# Altium footprint library Test.PcbLib: 245 footprints (part 10 of 17)
Each footprint in its own frame and in the unit in brackets; x right, y up, seen from the top. Pads: shape width x height; smd on the part's side, far side on the other; paste and mask are expansions set on the pad; w line width, h text height; cw(c..) or ccw(c..) is an arc to the next point about the centre after c.
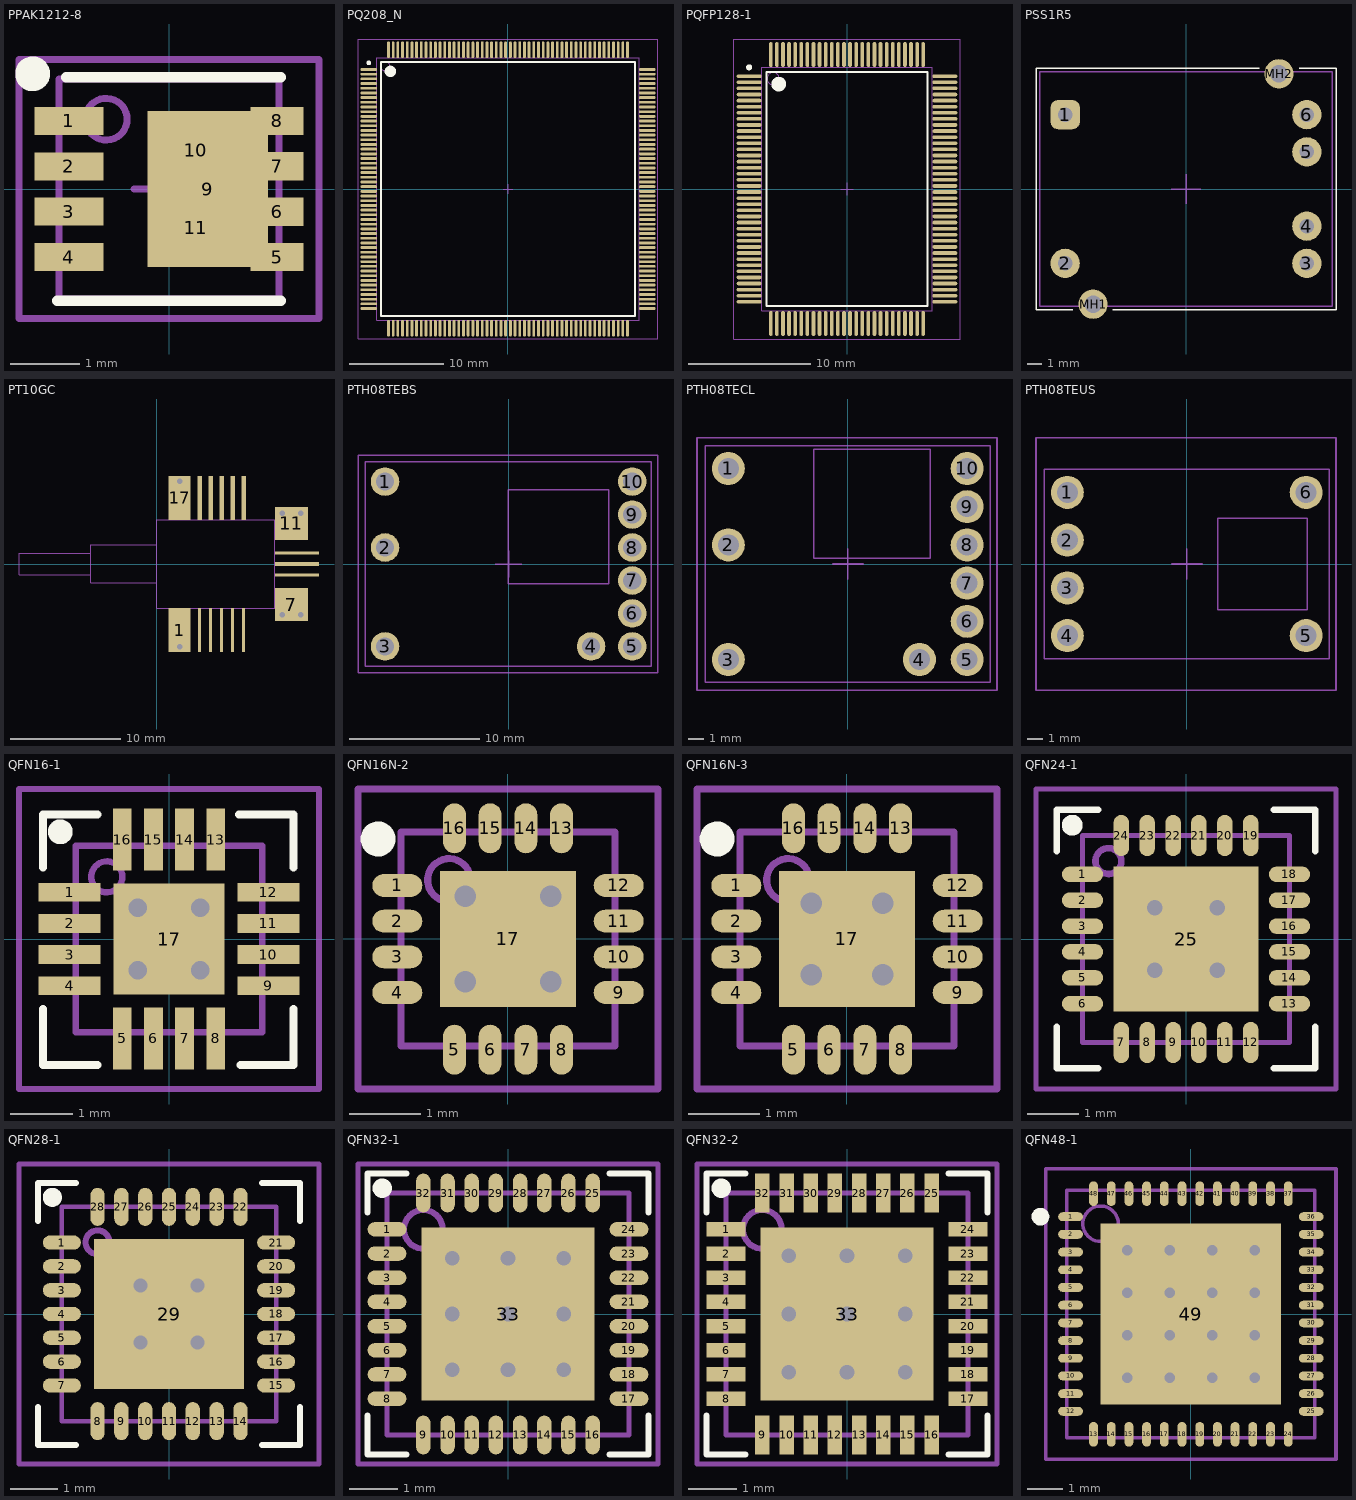
[diagram p9: the footprints below, top view; thin cyan lines are the x and y axes]

## PPAK1212-8 [mm] "QFN, 8-Leads, Body 3,2x3,2mm (max), Pitch 0,65mm, IPC Medium Density"
height 1.1
pads (11):
  rect 0.99x0.4 smd: 1(-1.435,0.975) 2(-1.435,0.325) 3(-1.435,-0.325) 4(-1.435,-0.975)
  rect 0.76x0.406 smd: 5(1.55,-0.975) 6(1.55,-0.325) 7(1.55,0.325) 8(1.55,0.975)
  rect 1.725x2.235 smd paste-2.54: 9(0.557,0)
  rect 1.016x0.813 on Top Paste: 10(0.381,0.559) 11(0.381,-0.559)
Top Overlay:
  circle w0.25: c-1.954,1.651 r0.125
  lines w0.15: -1.6,-1.6 1.6,-1.6 ; -1.473,1.6 1.6,1.6
Mechanical 13:
  circle w0.1: c-0.9,1 r0.3
  lines w0.1: -1.575,-1.575 -1.575,1.575 1.575,1.575 1.575,-1.575 -1.575,-1.575
Mechanical 15:
  lines w0.1: -0.5,0 0.5,0 ; 0,-0.5 0,0.5 ; -2.15,-1.854 -2.15,1.854 2.15,1.854 2.15,-1.854 -2.15,-1.854
3D body: height 1.1, standoff 0.02, extent -1.575,-1.575 1.575,1.575
3D body: height 1.11, standoff 1.1, extent -1.206,0.694 -0.594,1.306

## PQ208_N [mm] "208-Pin Plastic Quad Flat Pack (PQ208), IPC Medium Density"
height 4.1
pads (208):
  oval 1.8x0.3 smd mask+0.051: 1(-14.85,12.75) 2(-14.85,12.25) 3(-14.85,11.75) 4(-14.85,11.25) 5(-14.85,10.75) 6(-14.85,10.25) 7(-14.85,9.75) 8(-14.85,9.25) 9(-14.85,8.75) 10(-14.85,8.25) 11(-14.85,7.75) 12(-14.85,7.25) 13(-14.85,6.75) 14(-14.85,6.25) 15(-14.85,5.75) 16(-14.85,5.25) 17(-14.85,4.75) 18(-14.85,4.25) 19(-14.85,3.75) 20(-14.85,3.25) 21(-14.85,2.75) 22(-14.85,2.25) 23(-14.85,1.75) 24(-14.85,1.25) 25(-14.85,0.75) 26(-14.85,0.25) 27(-14.85,-0.25) 28(-14.85,-0.75) 29(-14.85,-1.25) 30(-14.85,-1.75) 31(-14.85,-2.25) 32(-14.85,-2.75) 33(-14.85,-3.25) 34(-14.85,-3.75) 35(-14.85,-4.25) 36(-14.85,-4.75) 37(-14.85,-5.25) 38(-14.85,-5.75) 39(-14.85,-6.25) 40(-14.85,-6.75) 41(-14.85,-7.25) 42(-14.85,-7.75) 43(-14.85,-8.25) 44(-14.85,-8.75) 45(-14.85,-9.25) 46(-14.85,-9.75) 47(-14.85,-10.25) 48(-14.85,-10.75) 49(-14.85,-11.25) 50(-14.85,-11.75) 51(-14.85,-12.25) 52(-14.85,-12.75) 105(14.85,-12.75) 106(14.85,-12.25) 107(14.85,-11.75) 108(14.85,-11.25) 109(14.85,-10.75) 110(14.85,-10.25) 111(14.85,-9.75) 112(14.85,-9.25) 113(14.85,-8.75) 114(14.85,-8.25) 115(14.85,-7.75) 116(14.85,-7.25) 117(14.85,-6.75) 118(14.85,-6.25) 119(14.85,-5.75) 120(14.85,-5.25) 121(14.85,-4.75) 122(14.85,-4.25) 123(14.85,-3.75) 124(14.85,-3.25) 125(14.85,-2.75) 126(14.85,-2.25) 127(14.85,-1.75) 128(14.85,-1.25) 129(14.85,-0.75) 130(14.85,-0.25) 131(14.85,0.25) 132(14.85,0.75) 133(14.85,1.25) 134(14.85,1.75) 135(14.85,2.25) 136(14.85,2.75) 137(14.85,3.25) 138(14.85,3.75) 139(14.85,4.25) 140(14.85,4.75) 141(14.85,5.25) 142(14.85,5.75) 143(14.85,6.25) 144(14.85,6.75) 145(14.85,7.25) 146(14.85,7.75) 147(14.85,8.25) 148(14.85,8.75) 149(14.85,9.25) 150(14.85,9.75) 151(14.85,10.25) 152(14.85,10.75) 153(14.85,11.25) 154(14.85,11.75) 155(14.85,12.25) 156(14.85,12.75)
  oval 0.3x1.8 smd mask+0.051: 53(-12.75,-14.85) 54(-12.25,-14.85) 55(-11.75,-14.85) 56(-11.25,-14.85) 57(-10.75,-14.85) 58(-10.25,-14.85) 59(-9.75,-14.85) 60(-9.25,-14.85) 61(-8.75,-14.85) 62(-8.25,-14.85) 63(-7.75,-14.85) 64(-7.25,-14.85) 65(-6.75,-14.85) 66(-6.25,-14.85) 67(-5.75,-14.85) 68(-5.25,-14.85) 69(-4.75,-14.85) 70(-4.25,-14.85) 71(-3.75,-14.85) 72(-3.25,-14.85) 73(-2.75,-14.85) 74(-2.25,-14.85) 75(-1.75,-14.85) 76(-1.25,-14.85) 77(-0.75,-14.85) 78(-0.25,-14.85) 79(0.25,-14.85) 80(0.75,-14.85) 81(1.25,-14.85) 82(1.75,-14.85) 83(2.25,-14.85) 84(2.75,-14.85) 85(3.25,-14.85) 86(3.75,-14.85) 87(4.25,-14.85) 88(4.75,-14.85) 89(5.25,-14.85) 90(5.75,-14.85) 91(6.25,-14.85) 92(6.75,-14.85) 93(7.25,-14.85) 94(7.75,-14.85) 95(8.25,-14.85) 96(8.75,-14.85) 97(9.25,-14.85) 98(9.75,-14.85) 99(10.25,-14.85) 100(10.75,-14.85) 101(11.25,-14.85) 102(11.75,-14.85) 103(12.25,-14.85) 104(12.75,-14.85) 157(12.75,14.85) 158(12.25,14.85) 159(11.75,14.85) 160(11.25,14.85) 161(10.75,14.85) 162(10.25,14.85) 163(9.75,14.85) 164(9.25,14.85) 165(8.75,14.85) 166(8.25,14.85) 167(7.75,14.85) 168(7.25,14.85) 169(6.75,14.85) 170(6.25,14.85) 171(5.75,14.85) 172(5.25,14.85) 173(4.75,14.85) 174(4.25,14.85) 175(3.75,14.85) 176(3.25,14.85) 177(2.75,14.85) 178(2.25,14.85) 179(1.75,14.85) 180(1.25,14.85) 181(0.75,14.85) 182(0.25,14.85) 183(-0.25,14.85) 184(-0.75,14.85) 185(-1.25,14.85) 186(-1.75,14.85) 187(-2.25,14.85) 188(-2.75,14.85) 189(-3.25,14.85) 190(-3.75,14.85) 191(-4.25,14.85) 192(-4.75,14.85) 193(-5.25,14.85) 194(-5.75,14.85) 195(-6.25,14.85) 196(-6.75,14.85) 197(-7.25,14.85) 198(-7.75,14.85) 199(-8.25,14.85) 200(-8.75,14.85) 201(-9.25,14.85) 202(-9.75,14.85) 203(-10.25,14.85) 204(-10.75,14.85) 205(-11.25,14.85) 206(-11.75,14.85) 207(-12.25,14.85) 208(-12.75,14.85)
Top Overlay:
  circle w0.6: c-12.55,12.55 r0.3
  circle w0.25: c-14.85,13.45 r0.125
  lines w0.2: -13.55,-13.55 13.55,-13.55 13.55,13.55 -13.55,13.55 -13.55,-13.55
Mechanical 13:
  circle w0.1: c-13.1,13.1 r0.5
  lines w0.1: -14,-14 14,-14 14,14 -14,14 -14,-14
Mechanical 15:
  lines w0.1: -0.5,0 0.5,0 ; 0,-0.5 0,0.5 ; -16,-16 16,-16 16,16 -16,16 -16,-16
3D body: height 4.1, standoff 0, extent -14,-14 14,14

## PQFP128-1 [mm] "PQFP, 128-Leads, Body 23,4x17,4mm (max), Pitch 0,50mm, IPC Medium Density"
height 3.4
pads (128):
  oval 2.05x0.305 smd mask+0.025: 1(-8.025,9.25) 2(-8.025,8.75) 3(-8.025,8.25) 4(-8.025,7.75) 5(-8.025,7.25) 6(-8.025,6.75) 7(-8.025,6.25) 8(-8.025,5.75) 9(-8.025,5.25) 10(-8.025,4.75) 11(-8.025,4.25) 12(-8.025,3.75) 13(-8.025,3.25) 14(-8.025,2.75) 15(-8.025,2.25) 16(-8.025,1.75) 17(-8.025,1.25) 18(-8.025,0.75) 19(-8.025,0.25) 20(-8.025,-0.25) 21(-8.025,-0.75) 22(-8.025,-1.25) 23(-8.025,-1.75) 24(-8.025,-2.25) 25(-8.025,-2.75) 26(-8.025,-3.25) 27(-8.025,-3.75) 28(-8.025,-4.25) 29(-8.025,-4.75) 30(-8.025,-5.25) 31(-8.025,-5.75) 32(-8.025,-6.25) 33(-8.025,-6.75) 34(-8.025,-7.25) 35(-8.025,-7.75) 36(-8.025,-8.25) 37(-8.025,-8.75) 38(-8.025,-9.25) 65(8.025,-9.25) 66(8.025,-8.75) 67(8.025,-8.25) 68(8.025,-7.75) 69(8.025,-7.25) 70(8.025,-6.75) 71(8.025,-6.25) 72(8.025,-5.75) 73(8.025,-5.25) 74(8.025,-4.75) 75(8.025,-4.25) 76(8.025,-3.75) 77(8.025,-3.25) 78(8.025,-2.75) 79(8.025,-2.25) 80(8.025,-1.75) 81(8.025,-1.25) 82(8.025,-0.75) 83(8.025,-0.25) 84(8.025,0.25) 85(8.025,0.75) 86(8.025,1.25) 87(8.025,1.75) 88(8.025,2.25) 89(8.025,2.75) 90(8.025,3.25) 91(8.025,3.75) 92(8.025,4.25) 93(8.025,4.75) 94(8.025,5.25) 95(8.025,5.75) 96(8.025,6.25) 97(8.025,6.75) 98(8.025,7.25) 99(8.025,7.75) 100(8.025,8.25) 101(8.025,8.75) 102(8.025,9.25)
  oval 0.305x2.05 smd mask+0.025: 39(-6.25,-11.025) 40(-5.75,-11.025) 41(-5.25,-11.025) 42(-4.75,-11.025) 43(-4.25,-11.025) 44(-3.75,-11.025) 45(-3.25,-11.025) 46(-2.75,-11.025) 47(-2.25,-11.025) 48(-1.75,-11.025) 49(-1.25,-11.025) 50(-0.75,-11.025) 51(-0.25,-11.025) 52(0.25,-11.025) 53(0.75,-11.025) 54(1.25,-11.025) 55(1.75,-11.025) 56(2.25,-11.025) 57(2.75,-11.025) 58(3.25,-11.025) 59(3.75,-11.025) 60(4.25,-11.025) 61(4.75,-11.025) 62(5.25,-11.025) 63(5.75,-11.025) 64(6.25,-11.025) 103(6.25,11.025) 104(5.75,11.025) 105(5.25,11.025) 106(4.75,11.025) 107(4.25,11.025) 108(3.75,11.025) 109(3.25,11.025) 110(2.75,11.025) 111(2.25,11.025) 112(1.75,11.025) 113(1.25,11.025) 114(0.75,11.025) 115(0.25,11.025) 116(-0.25,11.025) 117(-0.75,11.025) 118(-1.25,11.025) 119(-1.75,11.025) 120(-2.25,11.025) 121(-2.75,11.025) 122(-3.25,11.025) 123(-3.75,11.025) 124(-4.25,11.025) 125(-4.75,11.025) 126(-5.25,11.025) 127(-5.75,11.025) 128(-6.25,11.025)
Top Overlay:
  circle w0.6: c-5.6,8.6 r0.3
  circle w0.25: c-8.025,9.975 r0.125
  lines w0.15: -6.6,-9.6 6.6,-9.6 6.6,9.6 -6.6,9.6 -6.6,-9.6
Mechanical 13:
  circle w0.1: c-6.05,9.05 r0.5
  lines w0.1: -7,-10 7,-10 7,10 -7,10 -7,-10
Mechanical 15:
  lines w0.1: -0.5,0 0.5,0 ; 0,-0.5 0,0.5 ; -9.3,-12.3 9.3,-12.3 9.3,12.3 -9.3,12.3 -9.3,-12.3
3D body: height 3.41, standoff 3.4, extent -6.45,8.65 -5.653,9.448
3D body: height 3.4, standoff 0.25, extent -7,-10 7,10

## PSS1R5 [mm] "DC-DC1.5W"
height 8
pads (8):
  rrect50% 2x2 hole 1: 1(-8.255,5.08)
  round 2 hole 1: 2(-8.255,-5.08) 3(8.255,-5.08) 4(8.255,-2.54) 5(8.255,2.54) 6(8.255,5.08)
  round 2 hole 1.2: MH1(-6.35,-7.874) MH2(6.35,7.874)
Top Overlay:
  lines w0.102: -7.75,-8.25 -10.25,-8.25 -10.25,8.25 5,8.25 ; -5,-8.25 10.25,-8.25 10.25,8.25 7.75,8.25
Mechanical 13:
  lines w0.102: -10,-8 10,-8 10,8 -10,8 -10,-8
Mechanical 15:
  lines w0.102: -1,0 1,0 ; 0,-1 0,1
3D body: height 8, standoff 0, extent -10,-8 10,8

## PT10GC [mm] "10Gb/s PIN Preamp Receiver PT10GC"
height 4
pads (17):
  rect 2x4 smd: 1(2.1,-6) 17(2.1,6)
  rect 0.3x4 smd: 2(3.9,-6) 3(4.9,-6) 4(5.9,-6) 5(6.9,-6) 6(7.9,-6)
  rect 3x3 smd: 7(12.25,-3.7) 11(12.25,3.7)
  rect 4x0.3 smd: 8(12.75,-1) 10(12.75,1)
  rect 4x0.4 smd: 9(12.75,0)
  rect 0.4x4 smd: 12(7.9,6) 13(6.9,6) 14(5.9,6) 15(4.9,6) 16(3.9,6)
via 11.4,-4.6 diameter 1 hole 0.5
via 13.1,-4.6 diameter 1 hole 0.5
via 13.1,4.6 diameter 1 hole 0.5
via 11.4,4.6 diameter 1 hole 0.5
via 2.1,-7.5 diameter 1 hole 0.5
via 2.1,7.5 diameter 1 hole 0.5
Mechanical 13:
  lines w0.102: -6,-0.996 -12.5,-0.996 -12.5,0.996 -6,0.996 ; -0.057,1.743 -6,1.743 -6,-1.7 0,-1.7 ; 0,-4 0,4 10.75,4 10.75,-4 0,-4
3D body: height 2.8, standoff 0.8, extent -12.5,-0.996 -6,0.996
3D body: height 3.55, standoff 0.05, extent -6,-1.743 0,1.743
3D body: height 4, standoff 0, extent 0,-4 10.75,4

## PTH08TEBS [mm] "Power Module 19x16x8.5mm  THT"
height 8.5
pads (10):
  round 2.2 hole 1.4: 1(-9.525,6.35) 2(-9.525,1.27) 3(-9.525,-6.35) 4(6.35,-6.35) 5(9.525,-6.35) 6(9.525,-3.81) 7(9.525,-1.27) 8(9.525,1.27) 9(9.525,3.81) 10(9.525,6.35)
Mechanical 13:
  lines w0.102: -11.049,-7.874 10.998,-7.874 10.998,7.874 -11.049,7.874 -11.049,-7.874 ; -0.051,-1.524 -0.051,5.715 7.696,5.715 7.696,-1.524 -0.051,-1.524
Mechanical 15:
  lines w0.102: -1.016,0 1.016,0 ; 0,-1.016 0,1.016 ; -11.608,-8.382 11.506,-8.382 11.506,8.382 -11.608,8.382 -11.608,-8.382
3D body: height 6, standoff 3.2, extent -10.846,-7.62 10.744,7.62
3D body: height 3.2, standoff 1.8, extent -11.049,-7.874 10.998,7.874
3D body: height 1.8, standoff 0.2, extent -10.719,-7.493 10.744,7.493
3D body: height 8.5, standoff 6, extent -0.051,-1.524 7.696,5.715
3D body: height 1.8, standoff -3.55, extent -10.035,5.84 -9.015,6.86
3D body: height 1.8, standoff -3.55, extent -10.035,0.76 -9.015,1.78
3D body: height 1.8, standoff -3.55, extent -10.035,-6.86 -9.015,-5.84
3D body: height 1.8, standoff -3.55, extent 5.84,-6.86 6.86,-5.84
3D body: height 1.8, standoff -3.55, extent 9.015,-6.86 10.035,-5.84
3D body: height 1.8, standoff -3.55, extent 9.015,-4.32 10.035,-3.3
3D body: height 1.8, standoff -3.55, extent 9.015,-1.78 10.035,-0.76
3D body: height 1.8, standoff -3.55, extent 9.015,0.76 10.035,1.78
3D body: height 1.8, standoff -3.55, extent 9.015,3.3 10.035,4.32
3D body: height 1.8, standoff -3.55, extent 9.015,5.84 10.035,6.86

## PTH08TECL [mm] "Power Module 22x16x8.5mm  THT"
height 8.5
pads (10):
  round 2.2 hole 1.4: 1(-7.95,6.35) 2(-7.95,1.27) 3(-7.95,-6.35) 4(4.75,-6.35) 5(7.925,-6.35) 6(7.925,-3.81) 7(7.925,-1.27) 8(7.925,1.27) 9(7.925,3.81) 10(7.925,6.35)
Mechanical 13:
  lines w0.102: -9.474,-7.874 9.449,-7.874 9.449,7.874 -9.474,7.874 -9.474,-7.874 ; -2.286,0.381 -2.286,7.62 5.461,7.62 5.461,0.381 -2.286,0.381
Mechanical 15:
  lines w0.102: -1.016,0 1.016,0 ; 0,-1.016 0,1.016 ; -10.033,-8.382 9.906,-8.382 9.906,8.382 -10.033,8.382 -10.033,-8.382
3D body: height 6, standoff 3.2, extent -9.271,-7.62 9.144,7.62
3D body: height 3.2, standoff 1.8, extent -9.474,-7.874 9.449,7.874
3D body: height 1.8, standoff 0.2, extent -9.144,-7.493 9.144,7.493
3D body: height 8.5, standoff 6, extent -2.286,0.381 5.461,7.62
3D body: height 1.8, standoff -3.55, extent -8.46,5.84 -7.44,6.86
3D body: height 1.8, standoff -3.55, extent -8.46,0.76 -7.44,1.78
3D body: height 1.8, standoff -3.55, extent -8.46,-6.86 -7.44,-5.84
3D body: height 1.8, standoff -3.55, extent 4.24,-6.86 5.26,-5.84
3D body: height 1.8, standoff -3.55, extent 7.415,-6.86 8.435,-5.84
3D body: height 1.8, standoff -3.55, extent 7.415,-4.32 8.435,-3.3
3D body: height 1.8, standoff -3.55, extent 7.415,-1.78 8.435,-0.76
3D body: height 1.8, standoff -3.55, extent 7.415,0.76 8.435,1.78
3D body: height 1.8, standoff -3.55, extent 7.415,3.3 8.435,4.32
3D body: height 1.8, standoff -3.55, extent 7.415,5.84 8.435,6.86

## PTH08TEUS [mm] "Power Module EUS 19x13x8.5mm  THT"
height 8.5
pads (6):
  round 2.2 hole 1.4: 1(-7.95,4.763) 2(-7.95,1.587) 3(-7.95,-1.587) 4(-7.95,-4.763) 5(7.925,-4.763) 6(7.925,4.763)
Mechanical 13:
  lines w0.102: -9.474,-6.285 9.449,-6.285 9.449,6.285 -9.474,6.285 -9.474,-6.285 ; 2.032,-3.048 2.032,3.048 8.001,3.048 8.001,-3.048 2.032,-3.048
Mechanical 15:
  lines w0.102: -1.016,0 1.016,0 ; 0,-1.016 0,1.016 ; -10.033,-8.382 9.906,-8.382 9.906,8.382 -10.033,8.382 -10.033,-8.382
3D body: height 6, standoff 3.2, extent -9.271,-6.2 9.144,6.2
3D body: height 3.2, standoff 1.8, extent -9.474,-6.285 9.449,6.285
3D body: height 1.8, standoff 0.2, extent -9.144,-6.1 9.144,6.1
3D body: height 8.5, standoff 6, extent 2.032,-3.048 8.001,3.048
3D body: height 0, standoff -3.56, extent 7.421,4.268 8.433,5.282
3D body: height 0, standoff -3.56, extent 7.421,-5.257 8.433,-4.243
3D body: height 0, standoff -3.56, extent -8.454,-5.257 -7.442,-4.243
3D body: height 0, standoff -3.56, extent -8.454,-2.082 -7.442,-1.068
3D body: height 0, standoff -3.56, extent -8.454,1.093 -7.442,2.107
3D body: height 0, standoff -3.56, extent -8.454,4.268 -7.442,5.282

## QFN16-1 [mm] "QFN16; 16 Leads; Body Width 3.0 mm; Pitch 0.5 mm"
height 0.9
pads (17):
  rect 1x0.3 smd mask+0.051: 1(-1.6,0.75) 2(-1.6,0.25) 3(-1.6,-0.25) 4(-1.6,-0.75) 9(1.6,-0.75) 10(1.6,-0.25) 11(1.6,0.25) 12(1.6,0.75)
  rect 0.3x1 smd mask+0.051: 5(-0.75,-1.6) 6(-0.25,-1.6) 7(0.25,-1.6) 8(0.75,-1.6) 13(0.75,1.6) 14(0.25,1.6) 15(-0.25,1.6) 16(-0.75,1.6)
  rect 1.778x1.778 smd paste-5 mask-5: 17(0,0)
via -0.5,-0.5 diameter 0.65 hole 0.3
via 0.5,-0.5 diameter 0.65 hole 0.3
via 0.5,0.5 diameter 0.65 hole 0.3
via -0.5,0.5 diameter 0.65 hole 0.3
Top Overlay:
  circle w0.2: c-1.75,1.725 r0.1
  lines w0.127: -2.025,-1.125 -2.025,-2.025 -1.15,-2.025 ; -2.025,1.15 -2.025,2 -1.15,2 ; 1.125,2 2,2 2,1.15 ; 1.15,-2.025 2,-2.025 2,-1.125
Top Paste:
  region: -0.35,0.175 -0.175,0.35 -0.175,0.875 0.175,0.875 0.175,0.35 0.35,0.175 0.875,0.175 0.875,-0.175 0.35,-0.175 0.175,-0.35 0.175,-0.875 -0.175,-0.875 -0.175,-0.35 -0.35,-0.175 -0.875,-0.175 -0.875,0.175
Top Solder:
  region: 0.925,0.925 0.925,0.5 0.831,0.5 0.806,0.627 0.734,0.734 0.627,0.806 0.5,0.831 0.373,0.806 0.266,0.734 0.194,0.627 0.169,0.5 0.175,0.5 0.169,0.5 0.194,0.373 0.266,0.266 0.373,0.194 0.5,0.169 0.5,0.175 0.5,0.169 0.627,0.194 0.734,0.266 0.806,0.373 0.831,0.5 0.825,0.5 0.925,0.5 0.925,0 0,0 0,0.925
  region: 0.925,-0.925 0.5,-0.925 0.5,-0.831 0.627,-0.806 0.734,-0.734 0.806,-0.627 0.831,-0.5 0.806,-0.373 0.734,-0.266 0.627,-0.194 0.5,-0.169 0.5,-0.175 0.5,-0.169 0.373,-0.194 0.266,-0.266 0.194,-0.373 0.169,-0.5 0.175,-0.5 0.169,-0.5 0.194,-0.627 0.266,-0.734 0.373,-0.806 0.5,-0.831 0.5,-0.825 0.5,-0.925 0,-0.925 0,0 0.925,0
  region: -0.925,-0.925 -0.925,-0.5 -0.831,-0.5 -0.806,-0.627 -0.734,-0.734 -0.627,-0.806 -0.5,-0.831 -0.373,-0.806 -0.266,-0.734 -0.194,-0.627 -0.169,-0.5 -0.175,-0.5 -0.169,-0.5 -0.194,-0.373 -0.266,-0.266 -0.373,-0.194 -0.5,-0.169 -0.5,-0.175 -0.5,-0.169 -0.627,-0.194 -0.734,-0.266 -0.806,-0.373 -0.831,-0.5 -0.825,-0.5 -0.925,-0.5 -0.925,0 0,0 0,-0.925
  region: -0.925,0.925 -0.5,0.925 -0.5,0.831 -0.627,0.806 -0.734,0.734 -0.806,0.627 -0.831,0.5 -0.806,0.373 -0.734,0.266 -0.627,0.194 -0.5,0.169 -0.5,0.175 -0.5,0.169 -0.373,0.194 -0.266,0.266 -0.194,0.373 -0.169,0.5 -0.175,0.5 -0.169,0.5 -0.194,0.627 -0.266,0.734 -0.373,0.806 -0.5,0.831 -0.5,0.825 -0.5,0.925 0,0.925 0,0 -0.925,0
Mechanical 13:
  circle w0.102: c-1,1 r0.25
  lines w0.1: -1.5,-1.5 -1.5,1.5 1.5,1.5 1.5,-1.5 -1.5,-1.5
Mechanical 15:
  lines w0.1: -2.413,-2.413 -2.413,2.413 2.413,2.413 2.413,-2.413 -2.413,-2.413
  lines w0.102: -0.508,0 0.508,0 ; 0,-0.508 0,0.508
3D body: height 0.9, standoff 0, extent -1.5,-1.5 1.5,1.5

## QFN16N-2 [mm] "QFN, 16-Leads, Body 3,0x3,0mm (max), Pitch 0,50mm, IPC Medium Density"
height 1
pads (17):
  oval 0.7x0.32 smd mask+0.051: 1(-1.55,0.75) 2(-1.55,0.25) 3(-1.55,-0.25) 4(-1.55,-0.75) 9(1.55,-0.75) 10(1.55,-0.25) 11(1.55,0.25) 12(1.55,0.75)
  oval 0.32x0.7 smd mask+0.051: 5(-0.75,-1.55) 6(-0.25,-1.55) 7(0.25,-1.55) 8(0.75,-1.55) 13(0.75,1.55) 14(0.25,1.55) 15(-0.25,1.55) 16(-0.75,1.55)
  rect 1.9x1.9 smd paste-5 mask-5: 17(0,0)
via -0.6,0.6 diameter 0.66 hole 0.3
via 0.6,0.6 diameter 0.66 hole 0.3
via -0.6,-0.6 diameter 0.66 hole 0.3
via 0.6,-0.6 diameter 0.66 hole 0.3
Top Overlay:
  circle w0.25: c-1.82,1.4 r0.12
Top Paste:
  region: -0.275,0.95 -0.275,0.45 -0.45,0.275 -0.95,0.275 -0.95,-0.275 -0.45,-0.275 -0.275,-0.45 -0.275,-0.95 0.275,-0.95 0.275,-0.45 0.45,-0.275 0.95,-0.275 0.95,0.275 0.45,0.275 0.275,0.45 0.275,0.95
Top Solder:
  region: -1,1 -0.6,1 -0.6,0.931 -0.727,0.906 -0.834,0.834 -0.906,0.727 -0.931,0.6 -0.906,0.473 -0.834,0.366 -0.727,0.294 -0.6,0.269 -0.6,0.275 -0.6,0.269 -0.473,0.294 -0.366,0.366 -0.294,0.473 -0.269,0.6 -0.275,0.6 -0.269,0.6 -0.294,0.727 -0.366,0.834 -0.473,0.906 -0.6,0.931 -0.6,0.925 -0.6,1 0,1 0,0 -1,0
  region: -1,-1 -1,-0.6 -0.931,-0.6 -0.906,-0.727 -0.834,-0.834 -0.727,-0.906 -0.6,-0.931 -0.473,-0.906 -0.366,-0.834 -0.294,-0.727 -0.269,-0.6 -0.275,-0.6 -0.269,-0.6 -0.294,-0.473 -0.366,-0.366 -0.473,-0.294 -0.6,-0.269 -0.6,-0.275 -0.6,-0.269 -0.727,-0.294 -0.834,-0.366 -0.906,-0.473 -0.931,-0.6 -0.925,-0.6 -1,-0.6 -1,0 0,0 0,-1
  region: 1,-1 0.6,-1 0.6,-0.931 0.727,-0.906 0.834,-0.834 0.906,-0.727 0.931,-0.6 0.906,-0.473 0.834,-0.366 0.727,-0.294 0.6,-0.269 0.6,-0.275 0.6,-0.269 0.473,-0.294 0.366,-0.366 0.294,-0.473 0.269,-0.6 0.275,-0.6 0.269,-0.6 0.294,-0.727 0.366,-0.834 0.473,-0.906 0.6,-0.931 0.6,-0.925 0.6,-1 0,-1 0,0 1,0
  region: 1,1 1,0.6 0.931,0.6 0.906,0.727 0.834,0.834 0.727,0.906 0.6,0.931 0.473,0.906 0.366,0.834 0.294,0.727 0.269,0.6 0.275,0.6 0.269,0.6 0.294,0.473 0.366,0.366 0.473,0.294 0.6,0.269 0.6,0.275 0.6,0.269 0.727,0.294 0.834,0.366 0.906,0.473 0.931,0.6 0.925,0.6 1,0.6 1,0 0,0 0,1
Mechanical 13:
  circle w0.1: c-0.825,0.825 r0.3
  lines w0.1: -1.5,-1.5 -1.5,1.5 1.5,1.5 1.5,-1.5 -1.5,-1.5
Mechanical 15:
  lines w0.1: -0.5,0 0.5,0 ; 0,-0.5 0,0.5 ; -2.1,-2.1 -2.1,2.1 2.1,2.1 2.1,-2.1 -2.1,-2.1
3D body: height 1.01, standoff 1, extent -1.233,0.417 -0.417,1.233
3D body: height 1, standoff 0.02, extent -1.5,-1.5 1.5,1.5

## QFN16N-3 [mm] "QFN, 16-Leads, Body 3,0x3,0mm (max), Pitch 0,50mm, IPC Medium Density"
height 1
pads (17):
  oval 0.7x0.32 smd mask+0.051: 1(-1.55,0.75) 2(-1.55,0.25) 3(-1.55,-0.25) 4(-1.55,-0.75) 9(1.55,-0.75) 10(1.55,-0.25) 11(1.55,0.25) 12(1.55,0.75)
  oval 0.32x0.7 smd mask+0.051: 5(-0.75,-1.55) 6(-0.25,-1.55) 7(0.25,-1.55) 8(0.75,-1.55) 13(0.75,1.55) 14(0.25,1.55) 15(-0.25,1.55) 16(-0.75,1.55)
  rect 1.9x1.9 smd paste-5 mask-5: 17(0,0)
via -0.5,0.5 diameter 0.65 hole 0.3
via -0.5,-0.5 diameter 0.65 hole 0.3
via 0.5,-0.5 diameter 0.65 hole 0.3
via 0.5,0.5 diameter 0.65 hole 0.3
Top Overlay:
  circle w0.25: c-1.82,1.4 r0.12
Top Paste:
  region: 0.65,-0.95 0.65,-0.825 0.825,-0.65 0.95,-0.65 0.95,-0.95
  region: 0.95,0.65 0.825,0.65 0.65,0.825 0.65,0.95 0.95,0.95
  region: -0.65,0.95 -0.65,0.825 -0.825,0.65 -0.95,0.65 -0.95,0.95
  region: -0.95,-0.65 -0.825,-0.65 -0.65,-0.825 -0.65,-0.95 -0.95,-0.95
  region: 0.175,-0.65 0.35,-0.825 0.35,-0.95 -0.35,-0.95 -0.35,-0.825 -0.175,-0.65
  region: -0.65,-0.175 -0.825,-0.35 -0.95,-0.35 -0.95,0.35 -0.825,0.35 -0.65,0.175
  region: -0.175,0.65 -0.35,0.825 -0.35,0.95 0.35,0.95 0.35,0.825 0.175,0.65
  region: 0.65,0.175 0.825,0.35 0.95,0.35 0.95,-0.35 0.825,-0.35 0.65,-0.175
  region: -0.175,0.35 0.175,0.35 0.35,0.175 0.35,-0.175 0.175,-0.35 -0.175,-0.35 -0.35,-0.175 -0.35,0.175
Top Solder:
  region: -0.975,0.975 -0.5,0.975 -0.5,0.831 -0.627,0.806 -0.734,0.734 -0.806,0.627 -0.831,0.5 -0.806,0.373 -0.734,0.266 -0.627,0.194 -0.5,0.169 -0.5,0.175 -0.5,-0.175 -0.5,-0.169 -0.627,-0.194 -0.734,-0.266 -0.806,-0.373 -0.831,-0.5 -0.806,-0.627 -0.734,-0.734 -0.627,-0.806 -0.5,-0.831 -0.373,-0.806 -0.266,-0.734 -0.194,-0.627 -0.169,-0.5 -0.175,-0.5 0.175,-0.5 0.169,-0.5 0.194,-0.627 0.266,-0.734 0.373,-0.806 0.5,-0.831 0.627,-0.806 0.734,-0.734 0.806,-0.627 0.831,-0.5 0.806,-0.373 0.734,-0.266 0.627,-0.194 0.5,-0.169 0.5,-0.175 0.5,0.175 0.5,0.169 0.627,0.194 0.734,0.266 0.806,0.373 0.831,0.5 0.806,0.627 0.734,0.734 0.627,0.806 0.5,0.831 0.373,0.806 0.266,0.734 0.194,0.627 0.169,0.5 0.175,0.5 0.169,0.5 0.194,0.373 0.266,0.266 0.373,0.194 0.5,0.169 0.5,0.175 0.5,-0.169 0.373,-0.194 0.266,-0.266 0.194,-0.373 0.169,-0.5 0.175,-0.5 -0.169,-0.5 -0.194,-0.373 -0.266,-0.266 -0.373,-0.194 -0.5,-0.169 -0.5,-0.175 -0.5,0.169 -0.373,0.194 -0.266,0.266 -0.194,0.373 -0.169,0.5 -0.175,0.5 -0.169,0.5 -0.194,0.627 -0.266,0.734 -0.373,0.806 -0.5,0.831 -0.5,0.825 -0.5,0.975 0.975,0.975 0.975,-0.975 -0.975,-0.975
Mechanical 13:
  circle w0.1: c-0.825,0.825 r0.3
  lines w0.1: -1.5,-1.5 -1.5,1.5 1.5,1.5 1.5,-1.5 -1.5,-1.5
Mechanical 15:
  lines w0.1: -0.5,0 0.5,0 ; 0,-0.5 0,0.5 ; -2.1,-2.1 -2.1,2.1 2.1,2.1 2.1,-2.1 -2.1,-2.1
3D body: height 1, standoff 0.02, extent -1.5,-1.5 1.5,1.5

## QFN24-1 [mm] "QFN24; 24 Leads; Body Width 4.0 mm; Pitch 0.5 mm"
height 0.9
pads (25):
  oval 0.8x0.3 smd mask+0.025: 1(-2,1.25) 2(-2,0.75) 3(-2,0.25) 4(-2,-0.25) 5(-2,-0.75) 6(-2,-1.25) 13(2,-1.25) 14(2,-0.75) 15(2,-0.25) 16(2,0.25) 17(2,0.75) 18(2,1.25)
  oval 0.3x0.8 smd mask+0.025: 7(-1.25,-2) 8(-0.75,-2) 9(-0.25,-2) 10(0.25,-2) 11(0.75,-2) 12(1.25,-2) 19(1.25,2) 20(0.75,2) 21(0.25,2) 22(-0.25,2) 23(-0.75,2) 24(-1.25,2)
  rect 2.8x2.8 smd paste-2.54 mask-2.54: 25(0,0)
via -0.6,-0.6 diameter 0.6 hole 0.3
via -0.6,0.6 diameter 0.6 hole 0.3
via 0.6,0.6 diameter 0.6 hole 0.3
via 0.6,-0.6 diameter 0.6 hole 0.3
Top Overlay:
  circle w0.2: c-2.2,2.2 r0.1
  lines w0.127: -2.5,-1.7 -2.5,-2.5 -1.7,-2.5 ; -2.5,1.7 -2.5,2.5 -1.7,2.5 ; 1.7,-2.5 2.5,-2.5 2.5,-1.7 ; 1.7,2.5 2.5,2.5 2.5,1.7
Top Paste:
  region: -0.45,1.3 -0.45,0.95 -0.25,0.75 0.25,0.75 0.45,0.95 0.45,1.3
  region: 1.3,0.45 0.95,0.45 0.75,0.25 0.75,-0.25 0.95,-0.45 1.3,-0.45
  region: -1.3,1.3 -0.725,1.3 -0.725,0.975 -0.95,0.75 -1.3,0.75
  region: 1.3,-1.3 0.725,-1.3 0.725,-0.975 0.95,-0.75 1.3,-0.75
  region: 1.3,1.3 1.3,0.725 0.975,0.725 0.75,0.95 0.75,1.3
  region: 0.45,-1.3 0.45,-0.95 0.25,-0.75 -0.25,-0.75 -0.45,-0.95 -0.45,-1.3
  region: -1.3,-0.45 -0.95,-0.45 -0.75,-0.25 -0.75,0.25 -0.95,0.45 -1.3,0.45
  region: -0.45,-0.25 -0.25,-0.45 0.25,-0.45 0.45,-0.25 0.45,0.25 0.25,0.45 -0.25,0.45 -0.45,0.25
  region: -1.3,-1.3 -1.3,-0.725 -0.975,-0.725 -0.75,-0.95 -0.75,-1.3
Top Solder:
  region: -1.4,1.4 -0.6,1.4 -0.6,0.9 -0.6,0.906 -0.717,0.883 -0.816,0.816 -0.883,0.717 -0.906,0.6 -0.883,0.483 -0.816,0.384 -0.717,0.317 -0.6,0.294 -0.483,0.317 -0.384,0.384 -0.317,0.483 -0.294,0.6 -0.3,0.6 -0.294,0.6 -0.317,0.717 -0.384,0.816 -0.483,0.883 -0.6,0.906 -0.6,0.9 -0.6,1.4 0.6,1.4 0.6,0.906 0.483,0.883 0.384,0.816 0.317,0.717 0.294,0.6 0.3,0.6 0.294,0.6 0.317,0.483 0.384,0.384 0.483,0.317 0.6,0.294 0.717,0.317 0.816,0.384 0.883,0.483 0.906,0.6 0.883,0.717 0.816,0.816 0.717,0.883 0.6,0.906 0.6,0.9 0.6,1.4 1.4,1.4 1.4,-0.6 0.906,-0.6 0.883,-0.483 0.816,-0.384 0.717,-0.317 0.6,-0.294 0.483,-0.317 0.384,-0.384 0.317,-0.483 0.294,-0.6 0.3,-0.6 0.294,-0.6 0.317,-0.717 0.384,-0.816 0.483,-0.883 0.6,-0.906 0.717,-0.883 0.816,-0.816 0.883,-0.717 0.906,-0.6 0.9,-0.6 1.4,-0.6 1.4,-1.4 -0.6,-1.4 -0.6,-0.906 -0.483,-0.883 -0.384,-0.816 -0.317,-0.717 -0.294,-0.6 -0.3,-0.6 -0.294,-0.6 -0.317,-0.483 -0.384,-0.384 -0.483,-0.317 -0.6,-0.294 -0.6,-0.3 -0.6,-0.294 -0.717,-0.317 -0.816,-0.384 -0.883,-0.483 -0.906,-0.6 -0.883,-0.717 -0.816,-0.816 -0.717,-0.883 -0.6,-0.906 -0.6,-0.9 -0.6,-1.4 -1.4,-1.4
Mechanical 13:
  circle w0.127: c-1.5,1.506 r0.25
  lines w0.1: -2,-2 -2,2 2,2 2,-2 -2,-2
Mechanical 15:
  lines w0.102: -1.016,0 1.016,0 ; 0,-1.016 0,1.016 ; -2.9,-2.9 2.9,-2.9 2.9,2.9 -2.9,2.9 -2.9,-2.9
3D body: height 0.9, standoff 0, extent -2,-2 2,2
3D body: height 0.9, standoff 0.9, extent -1.758,1.24 -1.246,1.758

## QFN28-1 [mm] "QFN28; 28 Leads; Body Width 5.0 mm; Pitch 0.5 mm"
height 0.9
pads (29):
  oval 0.8x0.3 smd mask+0.038: 1(-2.25,1.5) 2(-2.25,1) 3(-2.25,0.5) 4(-2.25,0) 5(-2.25,-0.5) 6(-2.25,-1) 7(-2.25,-1.5) 15(2.25,-1.5) 16(2.25,-1) 17(2.25,-0.5) 18(2.25,0) 19(2.25,0.5) 20(2.25,1) 21(2.25,1.5)
  oval 0.3x0.8 smd mask+0.038: 8(-1.5,-2.25) 9(-1,-2.25) 10(-0.5,-2.25) 11(0,-2.25) 12(0.5,-2.25) 13(1,-2.25) 14(1.5,-2.25) 22(1.5,2.25) 23(1,2.25) 24(0.5,2.25) 25(0,2.25) 26(-0.5,2.25) 27(-1,2.25) 28(-1.5,2.25)
  rect 3.15x3.15 smd paste-1.6 mask-1.6: 29(0,0)
via 0.6,-0.6 diameter 0.65 hole 0.3
via 0.6,0.6 diameter 0.65 hole 0.3
via -0.6,-0.6 diameter 0.65 hole 0.3
via -0.6,0.6 diameter 0.65 hole 0.3
Top Overlay:
  circle w0.2: c-2.45,2.45 r0.1
  lines w0.127: -2.75,-1.95 -2.75,-2.75 -1.95,-2.75 ; -2.75,1.95 -2.75,2.75 -1.95,2.75 ; 1.95,-2.75 2.75,-2.75 2.75,-1.95 ; 1.95,2.75 2.75,2.75 2.75,1.95
Top Paste:
  region: -0.2,0.45 -0.45,0.2 -0.45,-0.2 -0.2,-0.45 0.2,-0.45 0.45,-0.2 0.45,0.2 0.2,0.45
  region: 0.45,1.475 -0.45,1.475 -0.45,1 -0.2,0.75 0.2,0.75 0.45,1
  region: 1.475,-0.45 1.475,0.45 1,0.45 0.75,0.2 0.75,-0.2 1,-0.45
  region: -1.475,0.45 -1.475,-0.45 -1,-0.45 -0.75,-0.2 -0.75,0.2 -1,0.45
  region: -0.45,-1.475 0.45,-1.475 0.45,-1 0.2,-0.75 -0.2,-0.75 -0.45,-1
  region: -1.475,-0.75 -1.475,-1.475 -0.75,-1.475 -0.75,-1 -1,-0.75
  region: 0.75,-1.475 1.475,-1.475 1.475,-0.75 1,-0.75 0.75,-1
  region: 1.475,0.75 1.475,1.475 0.75,1.475 0.75,1 1,0.75
  region: -0.75,1.475 -1.475,1.475 -1.475,0.75 -1,0.75 -0.75,1
Top Solder:
  region: 1.6,1.6 1.6,0.6 0.906,0.6 0.883,0.717 0.816,0.816 0.717,0.883 0.6,0.906 0.483,0.883 0.384,0.816 0.317,0.717 0.294,0.6 0.3,0.6 0.294,0.6 0.317,0.483 0.384,0.384 0.483,0.317 0.6,0.294 0.6,0.3 0.6,0.294 0.717,0.317 0.816,0.384 0.883,0.483 0.906,0.6 0.9,0.6 1.6,0.6 1.6,-0.6 0.906,-0.6 0.883,-0.483 0.816,-0.384 0.717,-0.317 0.6,-0.294 0.6,-0.3 0.6,-0.294 0.483,-0.317 0.384,-0.384 0.317,-0.483 0.294,-0.6 0.3,-0.6 0.294,-0.6 0.317,-0.717 0.384,-0.816 0.483,-0.883 0.6,-0.906 0.717,-0.883 0.816,-0.816 0.883,-0.717 0.906,-0.6 0.9,-0.6 1.6,-0.6 1.6,-1.6 -1.6,-1.6 -1.6,-0.6 -0.906,-0.6 -0.883,-0.717 -0.816,-0.816 -0.717,-0.883 -0.6,-0.906 -0.483,-0.883 -0.384,-0.816 -0.317,-0.717 -0.294,-0.6 -0.3,-0.6 -0.294,-0.6 -0.317,-0.483 -0.384,-0.384 -0.483,-0.317 -0.6,-0.294 -0.6,-0.3 -0.6,-0.294 -0.717,-0.317 -0.816,-0.384 -0.883,-0.483 -0.906,-0.6 -0.9,-0.6 -1.6,-0.6 -1.6,0.6 -0.906,0.6 -0.883,0.483 -0.816,0.384 -0.717,0.317 -0.6,0.294 -0.6,0.3 -0.6,0.294 -0.483,0.317 -0.384,0.384 -0.317,0.483 -0.294,0.6 -0.3,0.6 -0.294,0.6 -0.317,0.717 -0.384,0.816 -0.483,0.883 -0.6,0.906 -0.717,0.883 -0.816,0.816 -0.883,0.717 -0.906,0.6 -0.9,0.6 -1.6,0.6 -1.6,1.6
Mechanical 13:
  circle w0.127: c-1.5,1.506 r0.25
  lines w0.1: -2.25,-2.25 2.25,-2.25 2.25,2.25 -2.25,2.25 -2.25,-2.25
Mechanical 15:
  lines w0.102: -1.016,0 1.016,0 ; 0,-1.016 0,1.016 ; -3.15,-3.15 -3.15,3.15 3.15,3.15 3.15,-3.15 -3.15,-3.15
3D body: height 0.9, standoff 0.9, extent -1.758,1.24 -1.246,1.758
3D body: height 0.9, standoff 0, extent -2,-2 2,2

## QFN32-1 [mm] "QFN32  W32pin 5.0x5.0mm H0.9mm R0.5 mm PP3.5x3.5mm"
height 0.9
pads (33):
  oval 0.8x0.3 smd mask+0.038: 1(-2.5,1.75) 2(-2.5,1.25) 3(-2.5,0.75) 4(-2.5,0.25) 5(-2.5,-0.25) 6(-2.5,-0.75) 7(-2.5,-1.25) 8(-2.5,-1.75) 17(2.5,-1.75) 18(2.5,-1.25) 19(2.5,-0.75) 20(2.5,-0.25) 21(2.5,0.25) 22(2.5,0.75) 23(2.5,1.25) 24(2.5,1.75)
  oval 0.3x0.8 smd mask+0.038: 9(-1.75,-2.5) 10(-1.25,-2.5) 11(-0.75,-2.5) 12(-0.25,-2.5) 13(0.25,-2.5) 14(0.75,-2.5) 15(1.25,-2.5) 16(1.75,-2.5) 25(1.75,2.5) 26(1.25,2.5) 27(0.75,2.5) 28(0.25,2.5) 29(-0.25,2.5) 30(-0.75,2.5) 31(-1.25,2.5) 32(-1.75,2.5)
  rect 3.58x3.58 smd paste-5 mask-5: 33(0,0)
via 0,0 diameter 0.6 hole 0.3
via -1.15,0 diameter 0.6 hole 0.3
via 1.15,0 diameter 0.6 hole 0.3
via 0,-1.15 diameter 0.6 hole 0.3
via -1.15,-1.15 diameter 0.6 hole 0.3
via 1.15,-1.15 diameter 0.6 hole 0.3
via 1.15,1.15 diameter 0.6 hole 0.3
via 0,1.15 diameter 0.6 hole 0.3
via -1.15,1.15 diameter 0.6 hole 0.3
Top Overlay:
  circle w0.2: c-2.6,2.6 r0.1
  lines w0.127: -2.9,-2.1 -2.9,-2.9 -2.1,-2.9 ; -2.9,2.1 -2.9,2.9 -2.1,2.9 ; 2.1,-2.9 2.9,-2.9 2.9,-2.1 ; 2.1,2.9 2.9,2.9 2.9,2.1
Top Paste:
  region: 1.75,-1.75 1.3,-1.75 1.3,-1.45 1.45,-1.3 1.75,-1.3
  region: -1.75,-1.75 -1.75,-1.3 -1.45,-1.3 -1.3,-1.45 -1.3,-1.75
  region: -1.75,1.75 -1.3,1.75 -1.3,1.45 -1.45,1.3 -1.75,1.3
  region: 1.75,1.75 1.75,1.3 1.45,1.3 1.3,1.45 1.3,1.75
  region: -0.15,1.75 -0.15,1.45 -0.3,1.3 -0.85,1.3 -1,1.45 -1,1.75
  region: 1,1.75 1,1.45 0.85,1.3 0.3,1.3 0.15,1.45 0.15,1.75
  region: 1.75,0.15 1.45,0.15 1.3,0.3 1.3,0.85 1.45,1 1.75,1
  region: 1.75,-1 1.45,-1 1.3,-0.85 1.3,-0.3 1.45,-0.15 1.75,-0.15
  region: 0.15,-1.75 0.15,-1.45 0.3,-1.3 0.85,-1.3 1,-1.45 1,-1.75
  region: -1,-1.75 -1,-1.45 -0.85,-1.3 -0.3,-1.3 -0.15,-1.45 -0.15,-1.75
  region: -1.75,-0.15 -1.45,-0.15 -1.3,-0.3 -1.3,-0.85 -1.45,-1 -1.75,-1
  region: -1.75,1 -1.45,1 -1.3,0.85 -1.3,0.3 -1.45,0.15 -1.75,0.15
  region: 0.85,1 1,0.85 1,0.3 0.85,0.15 0.3,0.15 0.15,0.3 0.15,0.85 0.3,1
  region: 1,-0.85 0.85,-1 0.3,-1 0.15,-0.85 0.15,-0.3 0.3,-0.15 0.85,-0.15 1,-0.3
  region: -0.85,-1 -1,-0.85 -1,-0.3 -0.85,-0.15 -0.3,-0.15 -0.15,-0.3 -0.15,-0.85 -0.3,-1
  region: -1,0.85 -0.85,1 -0.3,1 -0.15,0.85 -0.15,0.3 -0.3,0.15 -0.85,0.15 -1,0.3
Top Solder:
  drawing of 2 lines, arcs and shapes, not listed
Mechanical 13:
  circle w0.127: c-1.75,1.75 r0.4
  lines w0.1: -2.5,-2.5 2.5,-2.5 2.5,2.5 -2.5,2.5 -2.5,-2.5
Mechanical 15:
  lines w0.102: -1.016,0 1.016,0 ; 0,-1.016 0,1.016 ; -3.1,-3.1 -3.1,3.1 3.1,3.1 3.1,-3.1 -3.1,-3.1
3D body: height 0.9, standoff 0, extent -2.5,-2.5 2.5,2.5
3D body: height 0.91, standoff 0.9, extent -2.158,1.342 -1.342,2.158

## QFN32-2 [mm] "QFN32  W32pin 5.0x5.0mm H0.75mm R0.5 mm PP3.5x3.5mm"
height 0.75
pads (33):
  rect 0.8x0.3 smd paste+0 mask+0.038: 1(-2.5,1.75) 2(-2.5,1.25) 3(-2.5,0.75) 4(-2.5,0.25) 5(-2.5,-0.25) 6(-2.5,-0.75) 7(-2.5,-1.25) 8(-2.5,-1.75) 17(2.5,-1.75) 18(2.5,-1.25) 19(2.5,-0.75) 20(2.5,-0.25) 21(2.5,0.25) 22(2.5,0.75) 23(2.5,1.25) 24(2.5,1.75)
  rect 0.3x0.8 smd paste+0 mask+0.038: 9(-1.75,-2.5) 10(-1.25,-2.5) 11(-0.75,-2.5) 12(-0.25,-2.5) 13(0.25,-2.5) 14(0.75,-2.5) 15(1.25,-2.5) 16(1.75,-2.5) 25(1.75,2.5) 26(1.25,2.5) 27(0.75,2.5) 28(0.25,2.5) 29(-0.25,2.5) 30(-0.75,2.5) 31(-1.25,2.5) 32(-1.75,2.5)
  rect 3.58x3.58 smd paste-1.803 mask-1.803: 33(0,0)
via -1.2,1.2 diameter 0.65 hole 0.3
via -1.2,-1.2 diameter 0.65 hole 0.3
via 1.2,-1.2 diameter 0.65 hole 0.3
via 0,-1.2 diameter 0.65 hole 0.3
via -1.2,0 diameter 0.65 hole 0.3
via 1.2,0 diameter 0.65 hole 0.3
via 1.2,1.2 diameter 0.65 hole 0.3
via 0,0 diameter 0.65 hole 0.3
via 0,1.2 diameter 0.65 hole 0.3
Top Overlay:
  circle w0.2: c-2.6,2.6 r0.1
  lines w0.127: -2.9,-2.1 -2.9,-2.9 -2.1,-2.9 ; -2.9,2.1 -2.9,2.9 -2.1,2.9 ; 2.1,-2.9 2.9,-2.9 2.9,-2.1 ; 2.1,2.9 2.9,2.9 2.9,2.1
Top Paste:
  region: -1.7,-1.35 -1.7,-1.7 -1.35,-1.7 -1.35,-1.6 -1.6,-1.35
  region: -1.35,1.7 -1.7,1.7 -1.7,1.35 -1.6,1.35 -1.35,1.6
  region: 1.7,1.35 1.7,1.7 1.35,1.7 1.35,1.6 1.6,1.35
  region: 1.35,-1.7 1.7,-1.7 1.7,-1.35 1.6,-1.35 1.35,-1.6
  region: -1.35,-0.4 -1.6,-0.15 -1.7,-0.15 -1.7,-1.05 -1.6,-1.05 -1.35,-0.8
  region: -1.35,0.8 -1.6,1.05 -1.7,1.05 -1.7,0.15 -1.6,0.15 -1.35,0.4
  region: -0.4,1.35 -0.15,1.6 -0.15,1.7 -1.05,1.7 -1.05,1.6 -0.8,1.35
  region: 0.8,1.35 1.05,1.6 1.05,1.7 0.15,1.7 0.15,1.6 0.4,1.35
  region: 1.35,-0.8 1.6,-1.05 1.7,-1.05 1.7,-0.15 1.6,-0.15 1.35,-0.4
  region: 1.35,0.4 1.6,0.15 1.7,0.15 1.7,1.05 1.6,1.05 1.35,0.8
  region: 0.4,-1.35 0.15,-1.6 0.15,-1.7 1.05,-1.7 1.05,-1.6 0.8,-1.35
  region: -0.8,-1.35 -1.05,-1.6 -1.05,-1.7 -0.15,-1.7 -0.15,-1.6 -0.4,-1.35
  region: 0.4,-0.15 0.15,-0.4 0.15,-0.8 0.4,-1.05 0.8,-1.05 1.05,-0.8 1.05,-0.4 0.8,-0.15
  region: -0.8,-0.15 -1.05,-0.4 -1.05,-0.8 -0.8,-1.05 -0.4,-1.05 -0.15,-0.8 -0.15,-0.4 -0.4,-0.15
  region: -0.8,1.05 -1.05,0.8 -1.05,0.4 -0.8,0.15 -0.4,0.15 -0.15,0.4 -0.15,0.8 -0.4,1.05
  region: 0.4,1.05 0.15,0.8 0.15,0.4 0.4,0.15 0.8,0.15 1.05,0.4 1.05,0.8 0.8,1.05
Top Solder:
  drawing of 1 lines, arcs and shapes, not listed
Mechanical 13:
  circle w0.127: c-1.75,1.75 r0.4
  lines w0.1: -2.5,-2.5 -2.5,2.5 2.5,2.5 2.5,-2.5 -2.5,-2.5
Mechanical 15:
  lines w0.102: -3.1,-3.1 3.1,-3.1 3.1,3.1 -3.1,3.1 -3.1,-3.1
3D body: height 0.91, standoff 0.9, extent -2.158,1.342 -1.342,2.158
3D body: height 0.9, standoff 0, extent -2.5,-2.5 2.5,2.5

## QFN48-1 [mm] "QFN48; 48 Leads; Body Width 7.0 mm; Pitch 0.5 mm"
height 0.8
pads (49):
  oval 0.7x0.25 smd mask+0.051: 1(-3.4,2.75) 2(-3.4,2.25) 3(-3.4,1.75) 4(-3.4,1.25) 5(-3.4,0.75) 6(-3.4,0.25) 7(-3.4,-0.25) 8(-3.4,-0.75) 9(-3.4,-1.25) 10(-3.4,-1.75) 11(-3.4,-2.25) 12(-3.4,-2.75) 25(3.4,-2.75) 26(3.4,-2.25) 27(3.4,-1.75) 28(3.4,-1.25) 29(3.4,-0.75) 30(3.4,-0.25) 31(3.4,0.25) 32(3.4,0.75) 33(3.4,1.25) 34(3.4,1.75) 35(3.4,2.25) 36(3.4,2.75)
  oval 0.25x0.7 smd mask+0.051: 13(-2.75,-3.4) 14(-2.25,-3.4) 15(-1.75,-3.4) 16(-1.25,-3.4) 17(-0.75,-3.4) 18(-0.25,-3.4) 19(0.25,-3.4) 20(0.75,-3.4) 21(1.25,-3.4) 22(1.75,-3.4) 23(2.25,-3.4) 24(2.75,-3.4) 37(2.75,3.4) 38(2.25,3.4) 39(1.75,3.4) 40(1.25,3.4) 41(0.75,3.4) 42(0.25,3.4) 43(-0.25,3.4) 44(-0.75,3.4) 45(-1.25,3.4) 46(-1.75,3.4) 47(-2.25,3.4) 48(-2.75,3.4)
  rect 5.1x5.1 smd paste-5 mask-5: 49(0,0)
via -1.8,1.8 diameter 0.6 hole 0.3
via -0.6,1.8 diameter 0.6 hole 0.3
via 0.6,1.8 diameter 0.6 hole 0.3
via 1.8,1.8 diameter 0.6 hole 0.3
via -1.8,0.6 diameter 0.6 hole 0.3
via -0.6,0.6 diameter 0.6 hole 0.3
via 0.6,0.6 diameter 0.6 hole 0.3
via 1.8,0.6 diameter 0.6 hole 0.3
via -1.8,-0.6 diameter 0.6 hole 0.3
via -0.6,-0.6 diameter 0.6 hole 0.3
via 0.6,-0.6 diameter 0.6 hole 0.3
via 1.8,-0.6 diameter 0.6 hole 0.3
via -1.8,-1.8 diameter 0.6 hole 0.3
via -0.6,-1.8 diameter 0.6 hole 0.3
via 0.6,-1.8 diameter 0.6 hole 0.3
via 1.8,-1.8 diameter 0.6 hole 0.3
Top Overlay:
  circle w0.25: c-4.25,2.75 r0.125
Top Paste:
  drawing of 25 lines, arcs and shapes, not listed
Top Solder:
  drawing of 1 lines, arcs and shapes, not listed
Mechanical 13:
  circle w0.1: c-2.55,2.55 r0.5
  lines w0.1: -3.5,-3.5 -3.5,3.5 3.5,3.5 3.5,-3.5 -3.5,-3.5
Mechanical 15:
  lines w0.1: -0.5,0 0.5,0 ; 0,-0.5 0,0.5 ; -4.1,-4.1 -4.1,4.1 4.1,4.1 4.1,-4.1 -4.1,-4.1
3D body: height 0.8, standoff 0.01, extent -3.5,-3.5 3.5,3.5